# Altium schematic symbol library THU VIEN SCH.SchLib: 1083 symbols (part 2 of 5) (continued)
## STM32F030F4P6 (continued)

## STM32F030R8T6
designator IC?, comment STM32F030R8T6 LQFP64
Dán; Ghi_Chu: Con; Ma_Hang: MH005689; Ten_Linh_Kien: STM32F030R8T6 LQFP64; Don_Vi: *; Kieu_Chan: *; Chung_Loai: Dán
pins: 1 VDD, 2 PC13/RTC_TAMP1/RTC_TS/RTC_OUT/WKUP2, 3 PC14-OSC32_IN/[OSC32_IN], 4 PC15-OSC32_OUT/[OSC32_OUT], 5 PF0-OSC_IN/I2C1_SDA/[OSC_IN], 6 PF1-OSC_OUT/I2C1_SCL/[[OSC_OUT], 7 NRST, 8 PC0/EVENTOUT/USART6_TX/USART7_TX/[ADC_IN10], 9 PC1/EVENTOUT/USART6_RX/USART7_RX/ADC_IN11], 10 PC2/SPI2_MISO/EVENTOUT/[ADC_IN12], 11 PC3/SPI2_MOSI/EVENTOUT/[ADC_IN13], 12 VSSA, 13 VDDA, 14 PA0/USART1_CTS/USART2_CTS/USART4_TX/[ADC_IN0/RTC_TAMP2/WKUP1], 15 PA1/USART1_RTS/USART2_RTS/EVENTOUT/USART4_RX/[ADC_IN1], 16 PA2/USART1_TX/USART2_TX/TIM15_CH1/[ADC_IN2], 17 PA3/USART1_RX/USART2_RX/TIM15_CH2/[ADC_IN3], 18 VSS, 19 VDD, 20 PA4/SPI1_NSS/USART1_CK/USART2_CK/TIM14_CH1/USART6_TX/[ADC_IN4], 21 PA5/SPI1_SCK/USART6_RX/[ADC_IN5], 22 PA6/SPI1_MISO/TIM3_CH1/TIM1_BKIN/TIM16_CH1/EVENTOUT/USART3_CTS/[ADC_IN6], 23 PA7/SPI1_MOSI/TIM3_CH2/TIM14_CH1/TIM1_CH1N/TIM17_CH1/EVENTOUT/[ADC_IN7], 24 PC4/EVENTOUT/USART3_TX/[ADC_IN14], 25 PC5/USART3_RX/[ADC_IN15], 26 PB0/TIM3_CH3/TIM1_CH2N/EVENTOUT/USART3_CK/[ADC_IN8], 27 PB1/TIM3_CH4/TIM14_CH1/TIM1_CH3N/USART3_RTS/[ADC_IN9], 28 PB2/, 29 PB10/SPI2_SCK/I2C1_SCL/I2C2_SCL/USART3_TX, 30 PB11/I2C1_SDA/I2C2_SDA/EVENTOUT/USART3_RX, 31 VSS, 32 VDD, 33 PB12/SPI1_NSS/SPI2_NSS/TIM1_BKIN/EVENTOUT/USART3_CK, 34 PB13/SPI1_SCK/SPI2_SCK/I2C2_SDA/TIM1_CH1N/USART3_CTS, 35 PB14/SPI1_MISO/SPI2_MISO/I2C2_SDA/TIM1_CH2NTIM15_CH1/USART3_RTS, 36 PB15/SPI1_MOSI/SPI2_MOSI/TIM1_CH3N/TIM15_CH1N/TIM15_CH2/[RTC_REFIN], 37 PC6/TIM3_CH1, 38 PC7/TIM3_CH2, 39 PC8/TIM3_CH3, 40 PC9/TIM3_CH4, 41 PA8/USART1_CK/TIM1_CH1/EVENTOUT/MCO, 42 PA9/USART1_TX/TIM1_CH2/TIM15_BKIN/I2C1_SCL, 43 PA10/USART1_RX/TIM1_CH3/TIM17_BKIN/I2C1_SDA, 44 PA11/USART1_CTS/TIM1_CH4/EVENTOUT/I2C2_SCL, 45 PA12/USART1_RTS/TIM1_ETR/EVENTOUT/I2C2_SDA, 46 PA13/IR_OUT/SWDIO, 47 VSS, 48 VDD, 49 PA14/USART1_TX/USART2_TX/SWCLK, 50 PA15/SPI1_NSS/USART1_RX/USART2_RX/USART4_RTS/EVENTOUT, 51 PC10/USART3_TX/USART4_TX, 52 PC11/USART3_RX/USART4_RX, 53 PC12/USART3_CK/USART4_CK/USART5_TX, 54 PD2/TIM3_ETR/USART3_RTS/USART5_RX, 55 PB3/SPI1_SCK/EVENTOUT/USART5_TX, 56 PB4/SPI1_MISO/TIM3_CH1/EVENTOUT/TIM17_BKIN/USART5_RX, 57 PB5/SPI1_MOSI/I2C1_SMBA/TIM16_BKIN/TIM3_CH2/USART5_CK_RTS, 58 PB6/I2C1_SCL/USART1_TX/TIM16_CH1N, 59 PB7/I2C1_SDA/USART1_RX/TIM17_CH1N/USART4_CTS, 60 BOOT0, 61 PB8/I2C1_SCL/TIM16_CH1, 62 PB9/I2C1_SDA/IR_OUT/SPI2_NSS/TIM17_CH1/EVENTOUT, 63 VSS, 64 VDD

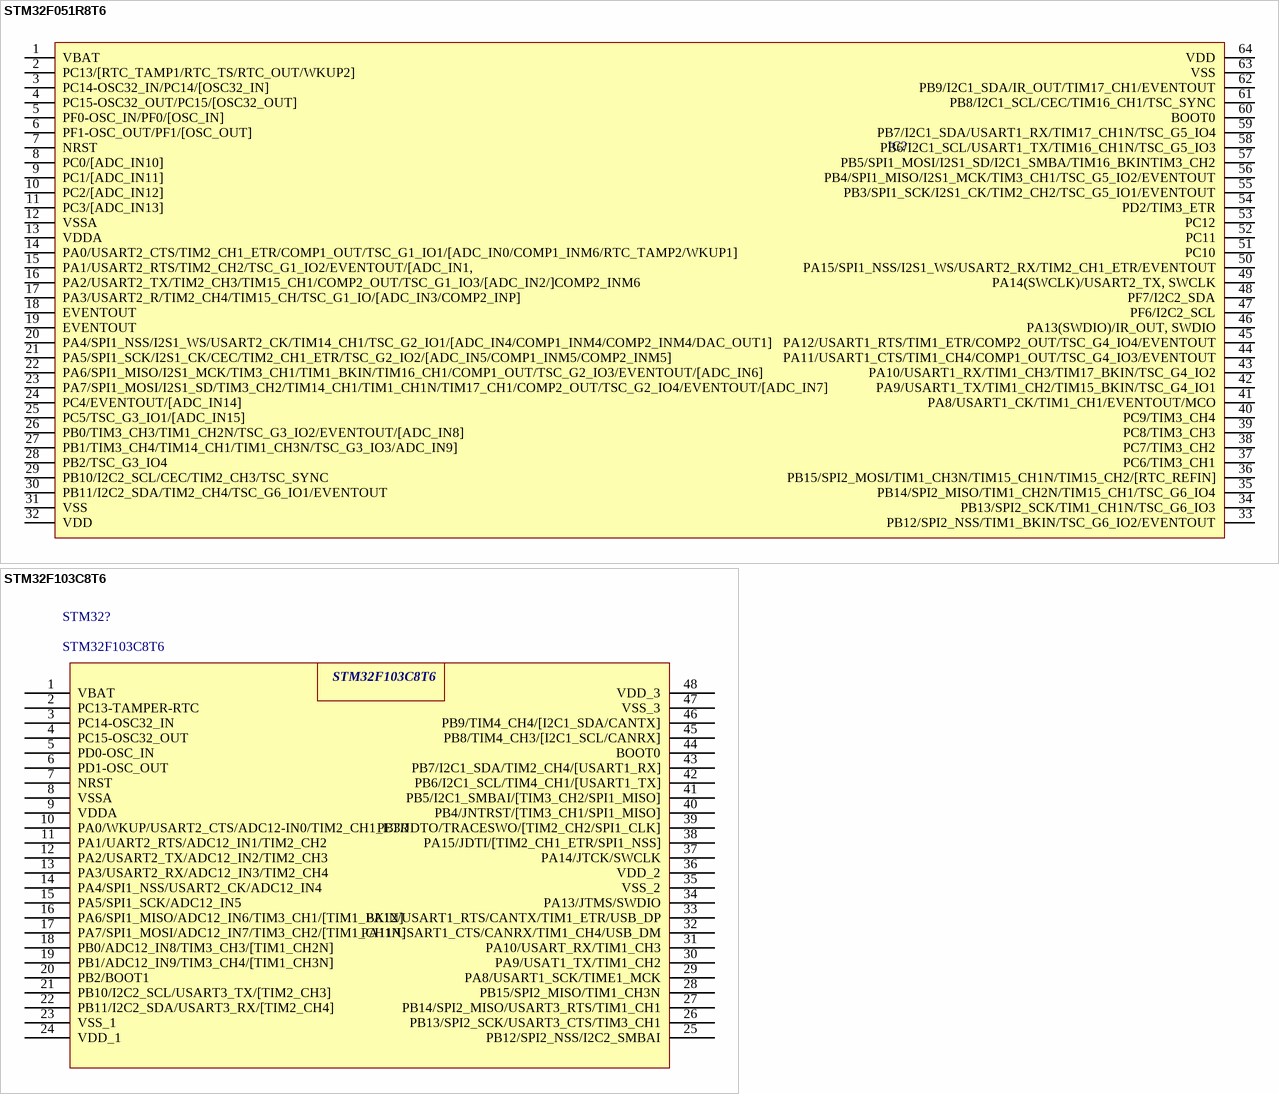
[diagram p10: symbols STM32F051R8T6 to STM32F103C8T6]

## STM32F051R8T6
designator IC?, comment STM32F051R8T6 LQFP64  (value not drawn)
Dán; Don_Vi: Con; Ma_Hang: MH005691; Ten_Linh_Kien: STM32F051R8T6 LQFP64; Ghi _Chu: *; Kieu_Chan: *; Chung_Loai: Dán
pins: 1 VBAT, 2 PC13/[RTC_TAMP1/RTC_TS/RTC_OUT/WKUP2], 3 PC14-OSC32_IN/PC14/[OSC32_IN], 4 PC15-OSC32_OUT/PC15/[OSC32_OUT], 5 PF0-OSC_IN/PF0/[OSC_IN], 6 PF1-OSC_OUT/PF1/[OSC_OUT], 7 NRST, 8 PC0/[ADC_IN10], 9 PC1/[ADC_IN11], 10 PC2/[ADC_IN12], 11 PC3/[ADC_IN13], 12 VSSA, 13 VDDA, 14 PA0/USART2_CTS/TIM2_CH1_ETR/COMP1_OUT/TSC_G1_IO1/[ADC_IN0/COMP1_INM6/RTC_TAMP2/WKUP1], 15 PA1/USART2_RTS/TIM2_CH2/TSC_G1_IO2/EVENTOUT/[ADC_IN1,, 16 PA2/USART2_TX/TIM2_CH3/TIM15_CH1/COMP2_OUT/TSC_G1_IO3/[ADC_IN2/]COMP2_INM6, 17 PA3/USART2_R/TIM2_CH4/TIM15_CH/TSC_G1_IO/[ADC_IN3/COMP2_INP], 18 EVENTOUT, 19 EVENTOUT , 20 PA4/SPI1_NSS/I2S1_WS/USART2_CK/TIM14_CH1/TSC_G2_IO1/[ADC_IN4/COMP1_INM4/COMP2_INM4/DAC_OUT1], 21 PA5/SPI1_SCK/I2S1_CK/CEC/TIM2_CH1_ETR/TSC_G2_IO2/[ADC_IN5/COMP1_INM5/COMP2_INM5], 22 PA6/SPI1_MISO/I2S1_MCK/TIM3_CH1/TIM1_BKIN/TIM16_CH1/COMP1_OUT/TSC_G2_IO3/EVENTOUT/[ADC_IN6], 23 PA7/SPI1_MOSI/I2S1_SD/TIM3_CH2/TIM14_CH1/TIM1_CH1N/TIM17_CH1/COMP2_OUT/TSC_G2_IO4/EVENTOUT/[ADC_IN7], 24 PC4/EVENTOUT/[ADC_IN14], 25 PC5/TSC_G3_IO1/[ADC_IN15], 26 PB0/TIM3_CH3/TIM1_CH2N/TSC_G3_IO2/EVENTOUT/[ADC_IN8], 27 PB1/TIM3_CH4/TIM14_CH1/TIM1_CH3N/TSC_G3_IO3/ADC_IN9], 28 PB2/TSC_G3_IO4, 29 PB10/I2C2_SCL/CEC/TIM2_CH3/TSC_SYNC, 30 PB11/I2C2_SDA/TIM2_CH4/TSC_G6_IO1/EVENTOUT, 31 VSS, 32 VDD, 33 PB12/SPI2_NSS/TIM1_BKIN/TSC_G6_IO2/EVENTOUT, 34 PB13/SPI2_SCK/TIM1_CH1N/TSC_G6_IO3, 35 PB14/SPI2_MISO/TIM1_CH2N/TIM15_CH1/TSC_G6_IO4, 36 PB15/SPI2_MOSI/TIM1_CH3N/TIM15_CH1N/TIM15_CH2/[RTC_REFIN], 37 PC6/TIM3_CH1, 38 PC7/TIM3_CH2, 39 PC8/TIM3_CH3, 40 PC9/TIM3_CH4, 41 PA8/USART1_CK/TIM1_CH1/EVENTOUT/MCO, 42 PA9/USART1_TX/TIM1_CH2/TIM15_BKIN/TSC_G4_IO1, 43 PA10/USART1_RX/TIM1_CH3/TIM17_BKIN/TSC_G4_IO2, 44 PA11/USART1_CTS/TIM1_CH4/COMP1_OUT/TSC_G4_IO3/EVENTOUT, 45 PA12/USART1_RTS/TIM1_ETR/COMP2_OUT/TSC_G4_IO4/EVENTOUT, 46 PA13(SWDIO)/IR_OUT, SWDIO, 47 PF6/I2C2_SCL, 48 PF7/I2C2_SDA, 49 PA14(SWCLK)/USART2_TX, SWCLK, 50 PA15/SPI1_NSS/I2S1_WS/USART2_RX/TIM2_CH1_ETR/EVENTOUT, 51 PC10, 52 PC11, 53 PC12, 54 PD2/TIM3_ETR, 55 PB3/SPI1_SCK/I2S1_CK/TIM2_CH2/TSC_G5_IO1/EVENTOUT, 56 PB4/SPI1_MISO/I2S1_MCK/TIM3_CH1/TSC_G5_IO2/EVENTOUT, 57 PB5/SPI1_MOSI/I2S1_SD/I2C1_SMBA/TIM16_BKINTIM3_CH2, 58 PB6/I2C1_SCL/USART1_TX/TIM16_CH1N/TSC_G5_IO3, 59 PB7/I2C1_SDA/USART1_RX/TIM17_CH1N/TSC_G5_IO4, 60 BOOT0, 61 PB8/I2C1_SCL/CEC/TIM16_CH1/TSC_SYNC, 62 PB9/I2C1_SDA/IR_OUT/TIM17_CH1/EVENTOUT, 63 VSS, 64 VDD

## STM32F103C8T6
designator STM32?
Dán; Ma_Hang: MH000567; Don_Vi: Con; Ten_Linh_Kien: STM32F103C8T6; Kieu_Chan: *; Ghi_Chu: *; Chung_Loai: Dán
pins: 1 VBAT, 2 PC13-TAMPER-RTC, 3 PC14-OSC32_IN, 4 PC15-OSC32_OUT, 5 PD0-OSC_IN, 6 PD1-OSC_OUT, 7 NRST, 8 VSSA, 9 VDDA, 10 PA0/WKUP/USART2_CTS/ADC12-IN0/TIM2_CH1_ETR, 11 PA1/UART2_RTS/ADC12_IN1/TIM2_CH2, 12 PA2/USART2_TX/ADC12_IN2/TIM2_CH3, 13 PA3/USART2_RX/ADC12_IN3/TIM2_CH4, 14 PA4/SPI1_NSS/USART2_CK/ADC12_IN4, 15 PA5/SPI1_SCK/ADC12_IN5, 16 PA6/SPI1_MISO/ADC12_IN6/TIM3_CH1/[TIM1_BKIN], 17 PA7/SPI1_MOSI/ADC12_IN7/TIM3_CH2/[TIM1_CH1N], 18 PB0/ADC12_IN8/TIM3_CH3/[TIM1_CH2N], 19 PB1/ADC12_IN9/TIM3_CH4/[TIM1_CH3N], 20 PB2/BOOT1, 21 PB10/I2C2_SCL/USART3_TX/[TIM2_CH3], 22 PB11/I2C2_SDA/USART3_RX/[TIM2_CH4], 23 VSS_1, 24 VDD_1, 25 PB12/SPI2_NSS/I2C2_SMBAI, 26 PB13/SPI2_SCK/USART3_CTS/TIM3_CH1, 27 PB14/SPI2_MISO/USART3_RTS/TIM1_CH1, 28 PB15/SPI2_MISO/TIM1_CH3N, 29 PA8/USART1_SCK/TIME1_MCK, 30 PA9/USAT1_TX/TIM1_CH2, 31 PA10/USART_RX/TIM1_CH3, 32 PA11/USART1_CTS/CANRX/TIM1_CH4/USB_DM, 33 PA12/USART1_RTS/CANTX/TIM1_ETR/USB_DP, 34 PA13/JTMS/SWDIO, 35 VSS_2, 36 VDD_2, 37 PA14/JTCK/SWCLK, 38 PA15/JDTI/[TIM2_CH1_ETR/SPI1_NSS], 39 PB3/JDTO/TRACESWO/[TIM2_CH2/SPI1_CLK], 40 PB4/JNTRST/[TIM3_CH1/SPI1_MISO], 41 PB5/I2C1_SMBAI/[TIM3_CH2/SPI1_MISO], 42 PB6/I2C1_SCL/TIM4_CH1/[USART1_TX], 43 PB7/I2C1_SDA/TIM2_CH4/[USART1_RX], 44 BOOT0, 45 PB8/TIM4_CH3/[I2C1_SCL/CANRX], 46 PB9/TIM4_CH4/[I2C1_SDA/CANTX], 47 VSS_3, 48 VDD_3

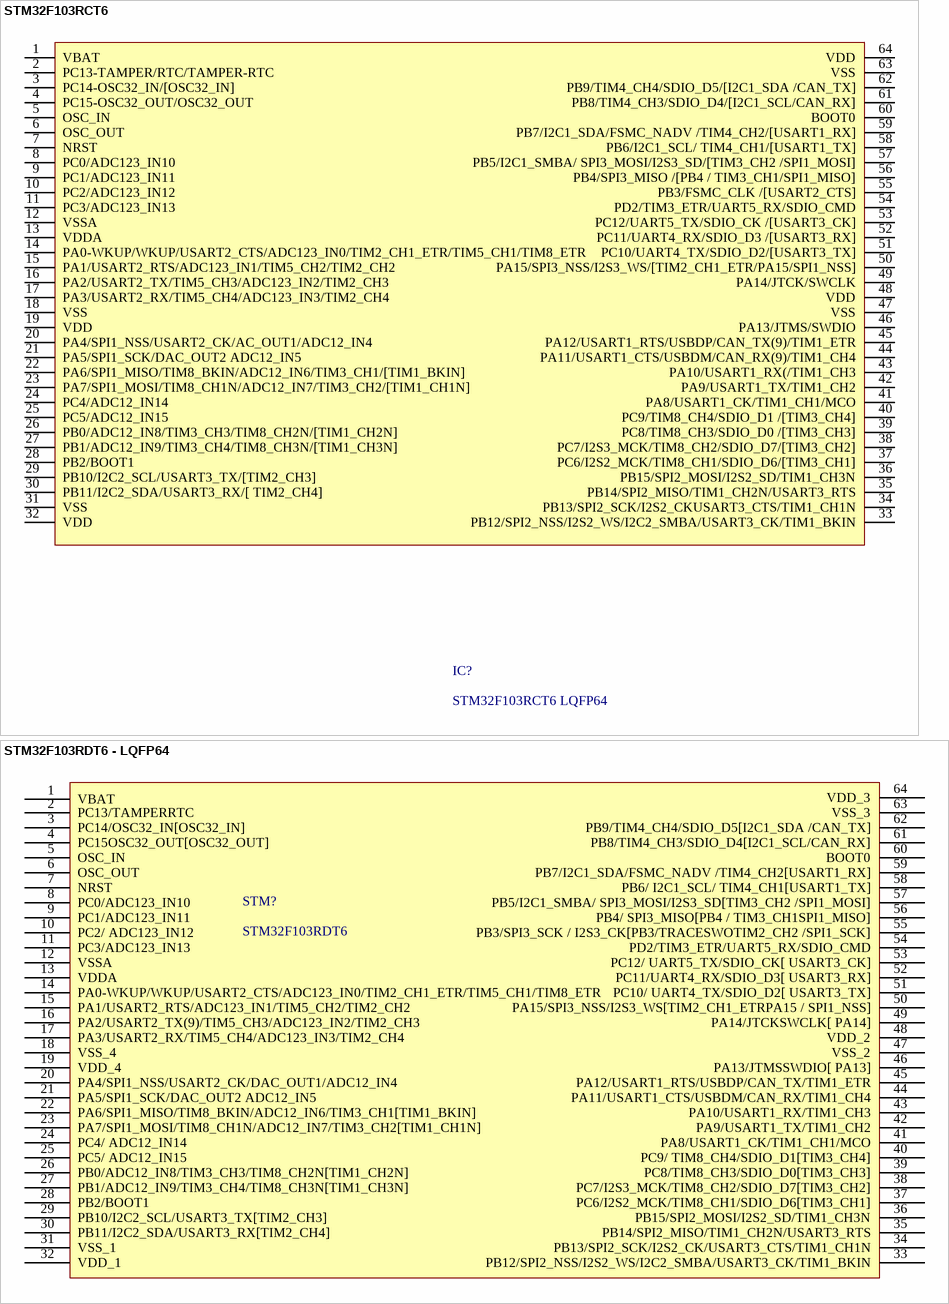
[diagram p11: symbols STM32F103RCT6 to STM32F103RDT6 - LQFP64]

## STM32F103RCT6
designator IC?, comment STM32F103RCT6 LQFP64
Dán; Ma_Hang: MH002495; Don_Vi: Con; Ten_Linh_Kien: STM32F103RCT6 LQFP64; Kieu_Chan: *; Ghi_Chu: *; Chung_Loai: Dán
pins: 1 VBAT, 2 PC13-TAMPER/RTC/TAMPER-RTC, 3 PC14-OSC32_IN/[OSC32_IN], 4 PC15-OSC32_OUT/OSC32_OUT, 5 OSC_IN, 6 OSC_OUT, 7 NRST, 8 PC0/ADC123_IN10, 9 PC1/ADC123_IN11, 10 PC2/ADC123_IN12, 11 PC3/ADC123_IN13, 12 VSSA, 13 VDDA, 14 PA0-WKUP/WKUP/USART2_CTS/ADC123_IN0/TIM2_CH1_ETR/TIM5_CH1/TIM8_ETR, 15 PA1/USART2_RTS/ADC123_IN1/TIM5_CH2/TIM2_CH2, 16 PA2/USART2_TX/TIM5_CH3/ADC123_IN2/TIM2_CH3, 17 PA3/USART2_RX/TIM5_CH4/ADC123_IN3/TIM2_CH4, 18 VSS, 19 VDD, 20 PA4/SPI1_NSS/USART2_CK/AC_OUT1/ADC12_IN4, 21 PA5/SPI1_SCK/DAC_OUT2 ADC12_IN5, 22 PA6/SPI1_MISO/TIM8_BKIN/ADC12_IN6/TIM3_CH1/[TIM1_BKIN], 23 PA7/SPI1_MOSI/TIM8_CH1N/ADC12_IN7/TIM3_CH2/[TIM1_CH1N], 24 PC4/ADC12_IN14, 25 PC5/ADC12_IN15, 26 PB0/ADC12_IN8/TIM3_CH3/TIM8_CH2N/[TIM1_CH2N], 27 PB1/ADC12_IN9/TIM3_CH4/TIM8_CH3N/[TIM1_CH3N], 28 PB2/BOOT1, 29 PB10/I2C2_SCL/USART3_TX/[TIM2_CH3], 30 PB11/I2C2_SDA/USART3_RX/[ TIM2_CH4], 31 VSS, 32 VDD, 33 PB12/SPI2_NSS/I2S2_WS/I2C2_SMBA/USART3_CK/TIM1_BKIN, 34 PB13/SPI2_SCK/I2S2_CKUSART3_CTS/TIM1_CH1N, 35 PB14/SPI2_MISO/TIM1_CH2N/USART3_RTS, 36 PB15/SPI2_MOSI/I2S2_SD/TIM1_CH3N, 37 PC6/I2S2_MCK/TIM8_CH1/SDIO_D6/[TIM3_CH1], 38 PC7/I2S3_MCK/TIM8_CH2/SDIO_D7/[TIM3_CH2], 39 PC8/TIM8_CH3/SDIO_D0 /[TIM3_CH3], 40 PC9/TIM8_CH4/SDIO_D1 /[TIM3_CH4], 41 PA8/USART1_CK/TIM1_CH1/MCO, 42 PA9/USART1_TX/TIM1_CH2, 43 PA10/USART1_RX(/TIM1_CH3, 44 PA11/USART1_CTS/USBDM/CAN_RX(9)/TIM1_CH4, 45 PA12/USART1_RTS/USBDP/CAN_TX(9)/TIM1_ETR, 46 PA13/JTMS/SWDIO, 47 VSS, 48 VDD, 49 PA14/JTCK/SWCLK, 50 PA15/SPI3_NSS/I2S3_WS/[TIM2_CH1_ETR/PA15/SPI1_NSS], 51 PC10/UART4_TX/SDIO_D2/[USART3_TX], 52 PC11/UART4_RX/SDIO_D3 /[USART3_RX], 53 PC12/UART5_TX/SDIO_CK /[USART3_CK], 54 PD2/TIM3_ETR/UART5_RX/SDIO_CMD, 55 PB3/FSMC_CLK /[USART2_CTS], 56 PB4/SPI3_MISO /[PB4 / TIM3_CH1/SPI1_MISO], 57 PB5/I2C1_SMBA/ SPI3_MOSI/I2S3_SD/[TIM3_CH2 /SPI1_MOSI], 58 PB6/I2C1_SCL/ TIM4_CH1/[USART1_TX], 59 PB7/I2C1_SDA/FSMC_NADV /TIM4_CH2/[USART1_RX], 60 BOOT0, 61 PB8/TIM4_CH3/SDIO_D4/[I2C1_SCL/CAN_RX], 62 PB9/TIM4_CH4/SDIO_D5/[I2C1_SDA /CAN_TX], 63 VSS, 64 VDD

## STM32F103RDT6 - LQFP64
designator STM?, comment STM32F103RDT6
Dán; Ma_Hang: MH004910; Ten_Linh_Kien: STM32F103RDT6 LQFP64; Don_Vi: Con; Kieu_Chan: *; Ghi_Chu: *; Chung_Loai: Dán
pins: 1 VBAT, 2 PC13/TAMPERRTC, 3 PC14/OSC32_IN[OSC32_IN], 4 PC15OSC32_OUT[OSC32_OUT], 5 OSC_IN, 6 OSC_OUT, 7 NRST, 8 PC0/ADC123_IN10, 9 PC1/ADC123_IN11, 10 PC2/ ADC123_IN12, 11 PC3/ADC123_IN13, 12 VSSA, 13 VDDA, 14 PA0-WKUP/WKUP/USART2_CTS/ADC123_IN0/TIM2_CH1_ETR/TIM5_CH1/TIM8_ETR, 15 PA1/USART2_RTS/ADC123_IN1/TIM5_CH2/TIM2_CH2, 16 PA2/USART2_TX(9)/TIM5_CH3/ADC123_IN2/TIM2_CH3, 17 PA3/USART2_RX/TIM5_CH4/ADC123_IN3/TIM2_CH4, 18 VSS_4, 19 VDD_4, 20 PA4/SPI1_NSS/USART2_CK/DAC_OUT1/ADC12_IN4, 21 PA5/SPI1_SCK/DAC_OUT2 ADC12_IN5 , 22 PA6/SPI1_MISO/TIM8_BKIN/ADC12_IN6/TIM3_CH1[TIM1_BKIN], 23 PA7/SPI1_MOSI/TIM8_CH1N/ADC12_IN7/TIM3_CH2[TIM1_CH1N], 24 PC4/ ADC12_IN14 , 25 PC5/ ADC12_IN15 , 26 PB0/ADC12_IN8/TIM3_CH3/TIM8_CH2N[TIM1_CH2N], 27 PB1/ADC12_IN9/TIM3_CH4/TIM8_CH3N[TIM1_CH3N], 28 PB2/BOOT1, 29 PB10/I2C2_SCL/USART3_TX[TIM2_CH3], 30 PB11/I2C2_SDA/USART3_RX[TIM2_CH4], 31 VSS_1, 32 VDD_1, 33 PB12/SPI2_NSS/I2S2_WS/I2C2_SMBA/USART3_CK/TIM1_BKIN, 34 PB13/SPI2_SCK/I2S2_CK/USART3_CTS/TIM1_CH1N, 35 PB14/SPI2_MISO/TIM1_CH2N/USART3_RTS, 36 PB15/SPI2_MOSI/I2S2_SD/TIM1_CH3N, 37 PC6/I2S2_MCK/TIM8_CH1/SDIO_D6[TIM3_CH1], 38 PC7/I2S3_MCK/TIM8_CH2/SDIO_D7[TIM3_CH2], 39 PC8/TIM8_CH3/SDIO_D0[TIM3_CH3], 40 PC9/ TIM8_CH4/SDIO_D1[TIM3_CH4], 41 PA8/USART1_CK/TIM1_CH1/MCO, 42 PA9/USART1_TX/TIM1_CH2, 43 PA10/USART1_RX/TIM1_CH3, 44 PA11/USART1_CTS/USBDM/CAN_RX/TIM1_CH4, 45 PA12/USART1_RTS/USBDP/CAN_TX/TIM1_ETR, 46 PA13/JTMSSWDIO[ PA13], 47 VSS_2, 48 VDD_2, 49 PA14/JTCKSWCLK[ PA14], 50 PA15/SPI3_NSS/I2S3_WS[TIM2_CH1_ETRPA15 / SPI1_NSS], 51 PC10/ UART4_TX/SDIO_D2[ USART3_TX], 52 PC11/UART4_RX/SDIO_D3[ USART3_RX], 53 PC12/ UART5_TX/SDIO_CK[ USART3_CK], 54 PD2/TIM3_ETR/UART5_RX/SDIO_CMD, 55 PB3/SPI3_SCK / I2S3_CK[PB3/TRACESWOTIM2_CH2 /SPI1_SCK], 56 PB4/ SPI3_MISO[PB4 / TIM3_CH1SPI1_MISO], 57 PB5/I2C1_SMBA/ SPI3_MOSI/I2S3_SD[TIM3_CH2 /SPI1_MOSI], 58 PB6/ I2C1_SCL/ TIM4_CH1[USART1_TX], 59 PB7/I2C1_SDA/FSMC_NADV /TIM4_CH2[USART1_RX], 60 BOOT0, 61 PB8/TIM4_CH3/SDIO_D4[I2C1_SCL/CAN_RX], 62 PB9/TIM4_CH4/SDIO_D5[I2C1_SDA /CAN_TX], 63 VSS_3, 64 VDD_3

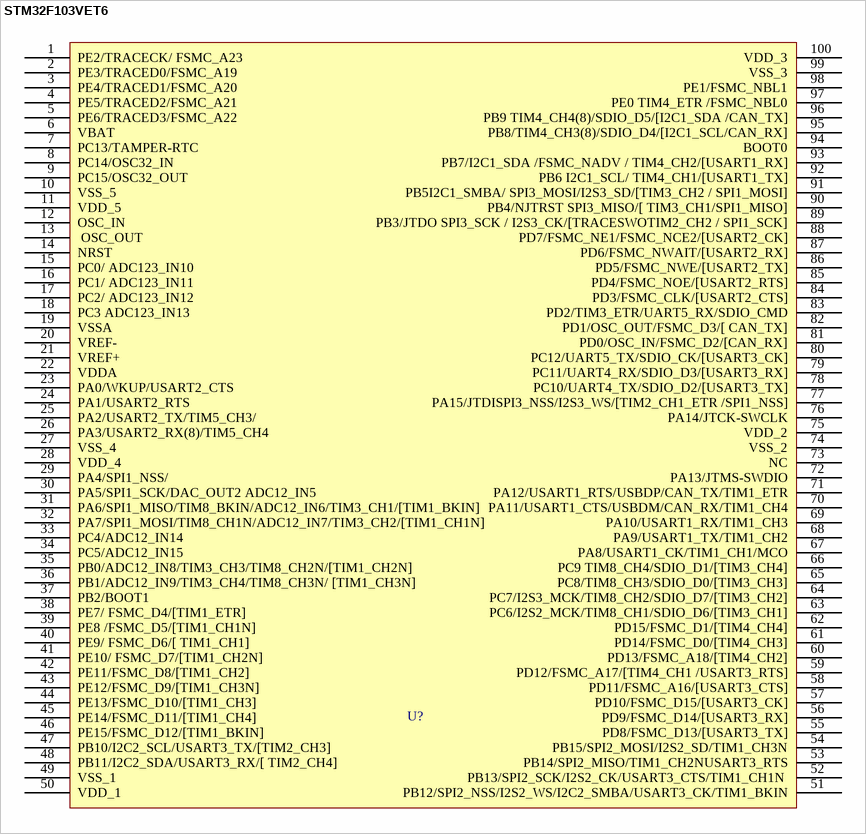
[diagram p12: symbol STM32F103VET6]

## STM32F103VET6
designator U?  (value not drawn)
Dán; Don_Vi: Con; Ma_Hang: MH001240; Ten_Linh_Kien: STM32F103VET6; Kieu_Chan: *; Ghi_Chu: *; Chung_Loai: Dán
footprint LQFP 100
pins: 1 PE2/TRACECK/ FSMC_A23, 2 PE3/TRACED0/FSMC_A19, 3 PE4/TRACED1/FSMC_A20, 4 PE5/TRACED2/FSMC_A21, 5 PE6/TRACED3/FSMC_A22, 6 VBAT, 7 PC13/TAMPER-RTC, 8 PC14/OSC32_IN, 9 PC15/OSC32_OUT, 10 VSS_5, 11 VDD_5, 12 OSC_IN, 13  OSC_OUT, 14 NRST, 15 PC0/ ADC123_IN10, 16 PC1/ ADC123_IN11, 17 PC2/ ADC123_IN12, 18 PC3 ADC123_IN13, 19 VSSA, 20 VREF-, 21 VREF+, 22 VDDA, 23 PA0/WKUP/USART2_CTS, 24 PA1/USART2_RTS, 25 PA2/USART2_TX/TIM5_CH3/, 26 PA3/USART2_RX(8)/TIM5_CH4, 27 VSS_4, 28 VDD_4, 29 PA4/SPI1_NSS/, 30 PA5/SPI1_SCK/DAC_OUT2 ADC12_IN5, 31 PA6/SPI1_MISO/TIM8_BKIN/ADC12_IN6/TIM3_CH1/[TIM1_BKIN], 32 PA7/SPI1_MOSI/TIM8_CH1N/ADC12_IN7/TIM3_CH2/[TIM1_CH1N], 33 PC4/ADC12_IN14 , 34 PC5/ADC12_IN15, 35 PB0/ADC12_IN8/TIM3_CH3/TIM8_CH2N/[TIM1_CH2N], 36 PB1/ADC12_IN9/TIM3_CH4/TIM8_CH3N/ [TIM1_CH3N], 37 PB2/BOOT1, 38 PE7/ FSMC_D4/[TIM1_ETR], 39 PE8 /FSMC_D5/[TIM1_CH1N], 40 PE9/ FSMC_D6/[ TIM1_CH1], 41 PE10/ FSMC_D7/[TIM1_CH2N], 42 PE11/FSMC_D8/[TIM1_CH2], 43 PE12/FSMC_D9/[TIM1_CH3N], 44 PE13/FSMC_D10/[TIM1_CH3], 45 PE14/FSMC_D11/[TIM1_CH4], 46 PE15/FSMC_D12/[TIM1_BKIN], 47 PB10/I2C2_SCL/USART3_TX/[TIM2_CH3], 48 PB11/I2C2_SDA/USART3_RX/[ TIM2_CH4], 49 VSS_1, 50 VDD_1, 51 PB12/SPI2_NSS/I2S2_WS/I2C2_SMBA/USART3_CK/TIM1_BKIN, 52 PB13/SPI2_SCK/I2S2_CK/USART3_CTS/TIM1_CH1N , 53 PB14/SPI2_MISO/TIM1_CH2NUSART3_RTS, 54 PB15/SPI2_MOSI/I2S2_SD/TIM1_CH3N, 55 PD8/FSMC_D13/[USART3_TX], 56 PD9/FSMC_D14/[USART3_RX], 57 PD10/FSMC_D15/[USART3_CK], 58 PD11/FSMC_A16/[USART3_CTS], 59 PD12/FSMC_A17/[TIM4_CH1 /USART3_RTS], 60 PD13/FSMC_A18/[TIM4_CH2], 61 PD14/FSMC_D0/[TIM4_CH3], 62 PD15/FSMC_D1/[TIM4_CH4], 63 PC6/I2S2_MCK/TIM8_CH1/SDIO_D6/[TIM3_CH1], 64 PC7/I2S3_MCK/TIM8_CH2/SDIO_D7/[TIM3_CH2], 65 PC8/TIM8_CH3/SDIO_D0/[TIM3_CH3], 66 PC9 TIM8_CH4/SDIO_D1/[TIM3_CH4], 67 PA8/USART1_CK/TIM1_CH1/MCO, 68 PA9/USART1_TX/TIM1_CH2, 69 PA10/USART1_RX/TIM1_CH3, 70 PA11/USART1_CTS/USBDM/CAN_RX/TIM1_CH4, 71 PA12/USART1_RTS/USBDP/CAN_TX/TIM1_ETR, 72 PA13/JTMS-SWDIO, 73 NC, 74 VSS_2, 75 VDD_2, 76 PA14/JTCK-SWCLK, 77 PA15/JTDISPI3_NSS/I2S3_WS/[TIM2_CH1_ETR /SPI1_NSS], 78 PC10/UART4_TX/SDIO_D2/[USART3_TX], 79 PC11/UART4_RX/SDIO_D3/[USART3_RX], 80 PC12/UART5_TX/SDIO_CK/[USART3_CK], 81 PD0/OSC_IN/FSMC_D2/[CAN_RX], 82 PD1/OSC_OUT/FSMC_D3/[ CAN_TX], 83 PD2/TIM3_ETR/UART5_RX/SDIO_CMD, 84 PD3/FSMC_CLK/[USART2_CTS], 85 PD4/FSMC_NOE/[USART2_RTS], 86 PD5/FSMC_NWE/[USART2_TX], 87 PD6/FSMC_NWAIT/[USART2_RX], 88 PD7/FSMC_NE1/FSMC_NCE2/[USART2_CK], 89 PB3/JTDO SPI3_SCK / I2S3_CK/[TRACESWOTIM2_CH2 / SPI1_SCK], 90 PB4/NJTRST SPI3_MISO/[ TIM3_CH1/SPI1_MISO], 91 PB5I2C1_SMBA/ SPI3_MOSI/I2S3_SD/[TIM3_CH2 / SPI1_MOSI], 92 PB6 I2C1_SCL/ TIM4_CH1/[USART1_TX], 93 PB7/I2C1_SDA /FSMC_NADV / TIM4_CH2/[USART1_RX], 94 BOOT0, 95 PB8/TIM4_CH3(8)/SDIO_D4/[I2C1_SCL/CAN_RX], 96 PB9 TIM4_CH4(8)/SDIO_D5/[I2C1_SDA /CAN_TX], 97 PE0 TIM4_ETR /FSMC_NBL0, 98 PE1/FSMC_NBL1, 99 VSS_3, 100 VDD_3

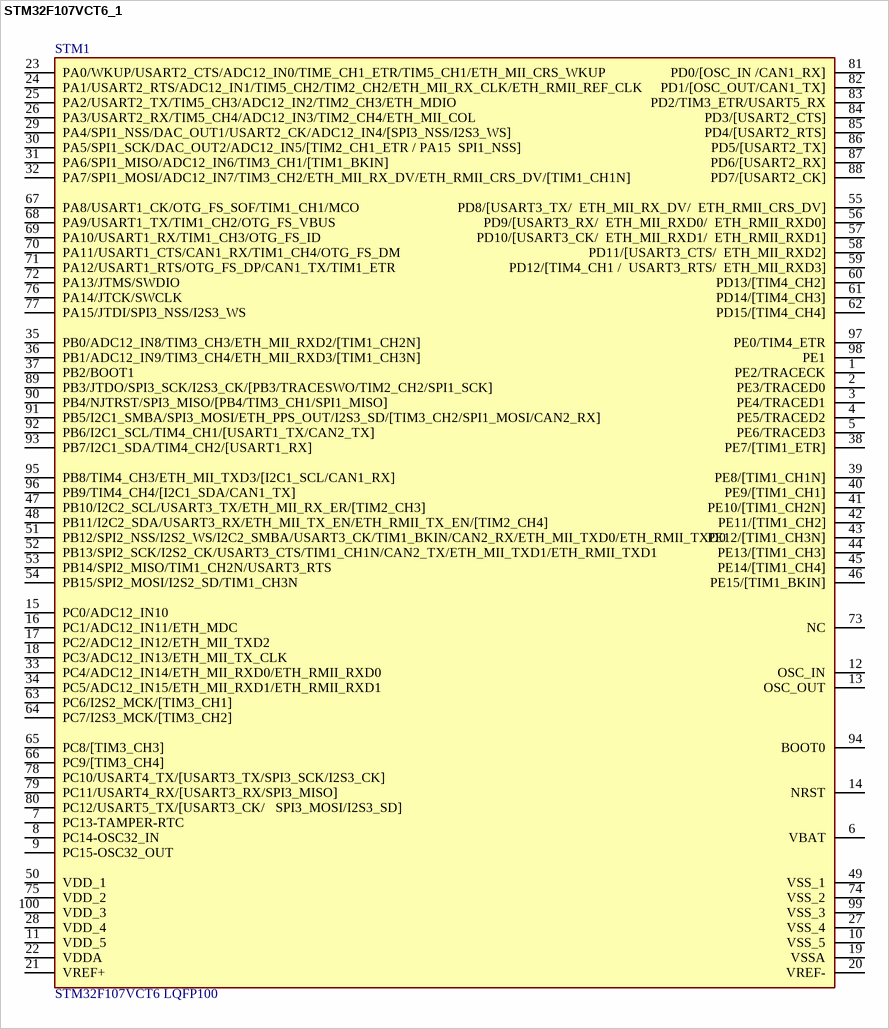
[diagram p13: symbol STM32F107VCT6_1]

## STM32F107VCT6_1
designator STM1, comment STM32F107VCT6 LQFP100
Dán; Don_Vi: Con; Ma_Hang: MH002437; Ten_Linh_Kien: STM32F107VCT6 LQFP100; Ghi_Chu: *; Kieu_Chan: *; Chung_Loai: Dán
footprint LQFP 100
pins: 1 PE2/TRACECK, 2 PE3/TRACED0, 3 PE4/TRACED1, 4 PE5/TRACED2, 5 PE6/TRACED3, 6 VBAT, 7 PC13-TAMPER-RTC, 8 PC14-OSC32_IN, 9 PC15-OSC32_OUT, 10 VSS_5, 11 VDD_5, 12 OSC_IN, 13 OSC_OUT, 14 NRST, 15 PC0/ADC12_IN10, 16 PC1/ADC12_IN11/ETH_MDC, 17 PC2/ADC12_IN12/ETH_MII_TXD2, 18 PC3/ADC12_IN13/ETH_MII_TX_CLK, 19 VSSA, 20 VREF-, 21 VREF+, 22 VDDA, 23 PA0/WKUP/USART2_CTS/ADC12_IN0/TIME_CH1_ETR/TIM5_CH1/ETH_MII_CRS_WKUP, 24 PA1/USART2_RTS/ADC12_IN1/TIM5_CH2/TIM2_CH2/ETH_MII_RX_CLK/ETH_RMII_REF_CLK, 25 PA2/USART2_TX/TIM5_CH3/ADC12_IN2/TIM2_CH3/ETH_MDIO, 26 PA3/USART2_RX/TIM5_CH4/ADC12_IN3/TIM2_CH4/ETH_MII_COL, 27 VSS_4, 28 VDD_4, 29 PA4/SPI1_NSS/DAC_OUT1/USART2_CK/ADC12_IN4/[SPI3_NSS/I2S3_WS], 30 PA5/SPI1_SCK/DAC_OUT2/ADC12_IN5/[TIM2_CH1_ETR / PA15  SPI1_NSS], 31 PA6/SPI1_MISO/ADC12_IN6/TIM3_CH1/[TIM1_BKIN], 32 PA7/SPI1_MOSI/ADC12_IN7/TIM3_CH2/ETH_MII_RX_DV/ETH_RMII_CRS_DV/[TIM1_CH1N], 33 PC4/ADC12_IN14/ETH_MII_RXD0/ETH_RMII_RXD0, 34 PC5/ADC12_IN15/ETH_MII_RXD1/ETH_RMII_RXD1, 35 PB0/ADC12_IN8/TIM3_CH3/ETH_MII_RXD2/[TIM1_CH2N], 36 PB1/ADC12_IN9/TIM3_CH4/ETH_MII_RXD3/[TIM1_CH3N], 37 PB2/BOOT1, 38 PE7/[TIM1_ETR], 39 PE8/[TIM1_CH1N], 40 PE9/[TIM1_CH1], 41 PE10/[TIM1_CH2N], 42 PE11/[TIM1_CH2], 43 PE12/[TIM1_CH3N], 44 PE13/[TIM1_CH3], 45 PE14/[TIM1_CH4], 46 PE15/[TIM1_BKIN], 47 PB10/I2C2_SCL/USART3_TX/ETH_MII_RX_ER/[TIM2_CH3], 48 PB11/I2C2_SDA/USART3_RX/ETH_MII_TX_EN/ETH_RMII_TX_EN/[TIM2_CH4], 49 VSS_1, 50 VDD_1, 51 PB12/SPI2_NSS/I2S2_WS/I2C2_SMBA/USART3_CK/TIM1_BKIN/CAN2_RX/ETH_MII_TXD0/ETH_RMII_TXD0, 52 PB13/SPI2_SCK/I2S2_CK/USART3_CTS/TIM1_CH1N/CAN2_TX/ETH_MII_TXD1/ETH_RMII_TXD1, 53 PB14/SPI2_MISO/TIM1_CH2N/USART3_RTS, 54 PB15/SPI2_MOSI/I2S2_SD/TIM1_CH3N, 55 PD8/[USART3_TX/  ETH_MII_RX_DV/  ETH_RMII_CRS_DV], 56 PD9/[USART3_RX/  ETH_MII_RXD0/  ETH_RMII_RXD0], 57 PD10/[USART3_CK/  ETH_MII_RXD1/  ETH_RMII_RXD1], 58 PD11/[USART3_CTS/  ETH_MII_RXD2], 59 PD12/[TIM4_CH1 /  USART3_RTS/  ETH_MII_RXD3], 60 PD13/[TIM4_CH2], 61 PD14/[TIM4_CH3], 62 PD15/[TIM4_CH4], 63 PC6/I2S2_MCK/[TIM3_CH1], 64 PC7/I2S3_MCK/[TIM3_CH2], 65 PC8/[TIM3_CH3], 66 PC9/[TIM3_CH4], 67 PA8/USART1_CK/OTG_FS_SOF/TIM1_CH1/MCO, 68 PA9/USART1_TX/TIM1_CH2/OTG_FS_VBUS, 69 PA10/USART1_RX/TIM1_CH3/OTG_FS_ID, 70 PA11/USART1_CTS/CAN1_RX/TIM1_CH4/OTG_FS_DM, 71 PA12/USART1_RTS/OTG_FS_DP/CAN1_TX/TIM1_ETR, 72 PA13/JTMS/SWDIO, 73 NC, 74 VSS_2, 75 VDD_2, 76 PA14/JTCK/SWCLK, 77 PA15/JTDI/SPI3_NSS/I2S3_WS, 78 PC10/USART4_TX/[USART3_TX/SPI3_SCK/I2S3_CK], 79 PC11/USART4_RX/[USART3_RX/SPI3_MISO], 80 PC12/USART5_TX/[USART3_CK/   SPI3_MOSI/I2S3_SD], 81 PD0/[OSC_IN /CAN1_RX], 82 PD1/[OSC_OUT/CAN1_TX], 83 PD2/TIM3_ETR/USART5_RX, 84 PD3/[USART2_CTS], 85 PD4/[USART2_RTS], 86 PD5/[USART2_TX], 87 PD6/[USART2_RX], 88 PD7/[USART2_CK], 89 PB3/JTDO/SPI3_SCK/I2S3_CK/[PB3/TRACESWO/TIM2_CH2/SPI1_SCK], 90 PB4/NJTRST/SPI3_MISO/[PB4/TIM3_CH1/SPI1_MISO], 91 PB5/I2C1_SMBA/SPI3_MOSI/ETH_PPS_OUT/I2S3_SD/[TIM3_CH2/SPI1_MOSI/CAN2_RX], 92 PB6/I2C1_SCL/TIM4_CH1/[USART1_TX/CAN2_TX], 93 PB7/I2C1_SDA/TIM4_CH2/[USART1_RX], 94 BOOT0, 95 PB8/TIM4_CH3/ETH_MII_TXD3/[I2C1_SCL/CAN1_RX], 96 PB9/TIM4_CH4/[I2C1_SDA/CAN1_TX], 97 PE0/TIM4_ETR, 98 PE1, 99 VSS_3, 100 VDD_3
